# Altium footprint library Amirreza.PcbLib: 524 footprints (part 17 of 33)
Each footprint in its own frame and in the unit in brackets; x right, y up, seen from the top. Pads: shape width x height; smd on the part's side, far side on the other; paste and mask are expansions set on the pad; w line width, h text height; cw(c..) or ccw(c..) is an arc to the next point about the centre after c.
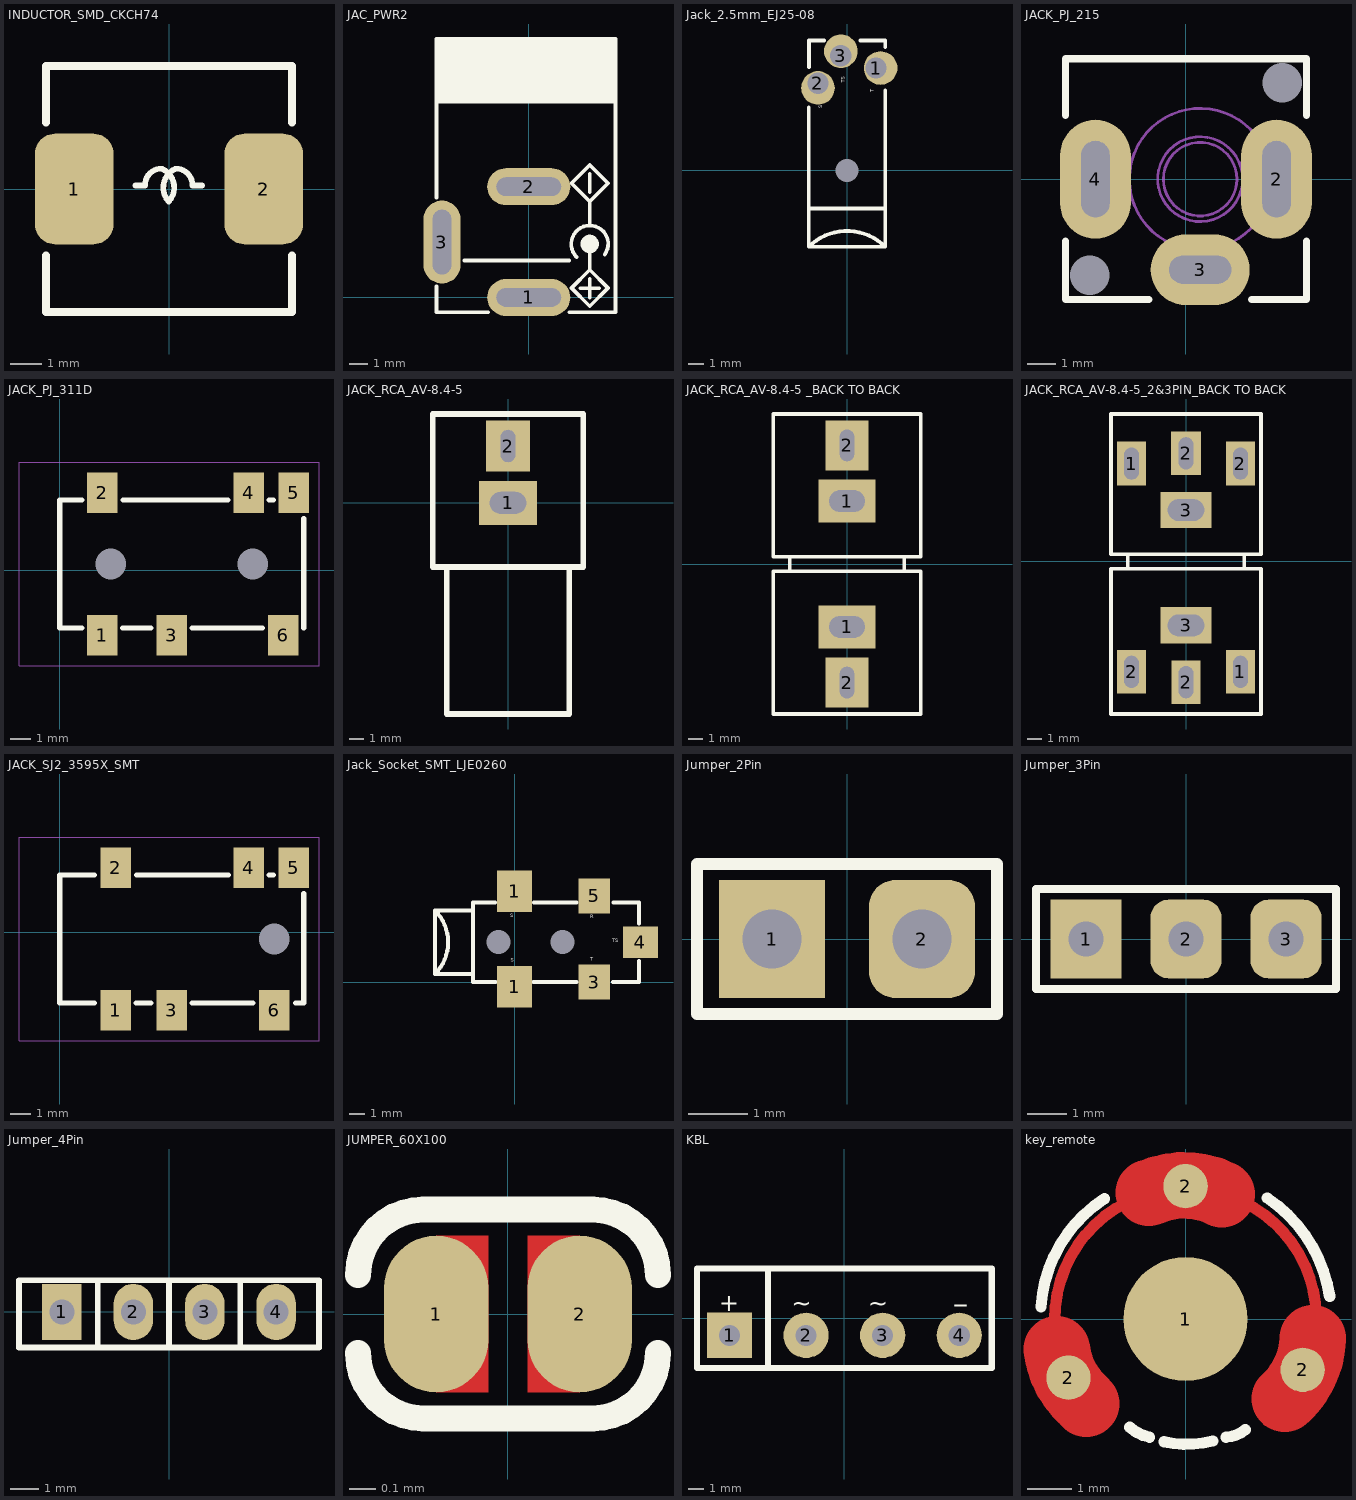
[diagram p16: the footprints below, top view; thin cyan lines are the x and y axes]

## INDUCTOR_SMD_CKCH74 [mm]
pads (2):
  rrect50% 2.5x3.5 smd: 1(-3,0) 2(3,0)
Top Overlay:
  lines w0.18: -1.061,0.112 -0.761,0.112 cw(c-0.247,0.127) -0.224,0.641 cw(c-0.487,0.046) -0.002,-0.388 ; -0.01,-0.395 cw(c0.469,0.046) 0.206,0.641 cw(c0.229,0.127) 0.743,0.112 1.043,0.112
  lines w0.254: -3.9,-2.1 -3.9,-3.9 3.9,-3.9 3.9,-2.1 ; -3.9,2.1 -3.9,3.9 3.9,3.9 3.9,2.1
3D body "User Library-DE0704.step": height 4.5, standoff 0, extent -3.65,-3.65 3.65,3.65

## JAC_PWR2 [mm] "DC POWER JACK, Power Jack KLDX-0202"
pads (3):
  oval 4.5x2 hole 1 slot 3.5 at 0 deg: 1(0,0) 2(0,6)
  oval 2x4.5 hole 1 slot 3.5 at 90 deg: 3(-4.7,3)
Top Overlay:
  circle w0.4: c3.3,2.9 r0.3
  rectangle: -5,10.5 4.7,14
  lines w0.2: -5,0.6 -5,-0.8 -2.2,-0.8 ; -5,5.4 -5,14 4.7,14 4.7,-0.8 2.2,-0.8 ; -3.5,2 2.2,2 ; 2.593,2.193 cw(c3.3,2.9) 4.119,2.326 ; 2.8,0.5 3.8,0.5 ; 3.3,0 3.3,1 ; 3.3,2.9 3.3,1.5 ; 3.3,3.9 3.3,5.2 ; 3.3,5.7 3.3,6.7 ; 3.3,1.5 2.31,0.51 3.3,-0.48 4.29,0.51 3.3,1.5 ; 3.3,5.2 4.29,6.19 3.3,7.18 2.31,6.19 3.3,5.2
3D body "KLDX-0202-A_rD2.STEP": height 10.8, standoff -4.1, extent -4.9,-0.65 4.5,13.85

## Jack_2.5mm_EJ25-08 [mm]
pads (4):
  round 0 hole 1.5: 0(0,0)
  round 2.2 hole 1.4 copper offset 0.3,0: 1(1.9,6.7)
  round 2.2 hole 1.4 copper offset 0,-0.3: 2(-1.9,5.7)
  round 2.2 hole 1.4 copper offset 0,0.3: 3(-0.4,7.5)
Top Overlay:
  lines w0.254: -2.5,4.11 -2.5,-2.5 ; -2.498,6.769 -2.498,8.5 -1.506,8.5 ; 0.894,8.51 2.5,8.51 2.5,8.06 ; 2.5,-2.5 -2.5,-2.5 ; 2.5,5.235 2.5,-5 ; -2.5,-5 cw(c0,-7.5) 2.5,-5 ; -2.5,-5 -2.5,-2.5 ; -2.5,-5 2.5,-5
  text "T" at 1.854,5.105 h0.4
  text "TS" at -0.051,5.74 h0.4
  text "S" at -1.524,4.064 h0.4
3D body "User Library-MS-108.STEP": height 5.9, standoff -1.6, extent -2.485,-4.405 2.515,6.995

## JACK_PJ_215 [mm] "Jack, Audio, Stereo, HT, 2.5mm, THD, PJ-215"
height 5.2
pads (5):
  oval 2.5x4.2 hole 1 slot 2.7 at 90 deg: 2(3.2,0) 4(-3.2,0)
  oval 3.5x2.5 hole 1 slot 2.2 at 0 deg: 3(0.5,-3.2)
  round 0 hole 1.4 unplated: ""(-3.4,-3.4) ""(3.4,3.4)
Top Overlay:
  lines w0.254: -4.254,-2.184 -4.254,-4.254 -1.315,-4.254 ; -4.254,2.261 -4.254,4.254 4.254,4.254 4.254,2.261 ; 2.318,-4.254 4.254,-4.254 4.254,-2.184
Mechanical 1:
  circle w0.1: c0.5,0 r1.5
  circle w0.1: c0.5,0 r2.5
  circle w0.1: c0.5,0 r1.3
3D body "pj-301c.stp": height 14, standoff -3.3, extent -5.131,-4.25 5.069,4.25

## JACK_PJ_311D [mm]
pads (8):
  round 0 hole 1.5 unplated: 0(2.5,0.317) 0(9.5,0.317)
  rect 1.5x2 smd: 1(2.1,-3.183) 2(2.1,3.817) 3(5.5,-3.183) 4(9.3,3.817) 5(11.5,3.817) 6(11,-3.183)
Top Overlay:
  lines w0.254: 1.092,-2.833 0,-2.833 0,3.467 1.093,3.467 ; 3.1,-2.833 4.496,-2.833 ; 3.125,3.467 8.28,3.467 ; 6.509,-2.833 9.962,-2.833 ; 10.286,3.467 10.512,3.467 ; 12,-2.833 12,2.538
Mechanical 13:
  lines w0.05: -2,-4.683 12.75,-4.683 12.75,5.317 -2,5.317 -2,-4.683
3D body "PJ311D_WOPos.STEP": height 4.8, standoff -0.7, extent -1.997,-4.032 12.303,4.468

## JACK_RCA_AV-8.4-5 [mm]
pads (2):
  rect 4x3 hole 1.5 slot 2.5 at 0 deg: 1(0,0)
  rect 3x3.5 hole 2.2 slot 1 at 0 deg: 2(0,3.9)
Top Overlay:
  lines w0.4: -4.2,-4.4 -4.2,-14.478 4.2,-14.478 4.2,-4.4 ; -5.16,-4.4 -5.16,6.096 5.16,6.096 5.16,-4.4 -5.16,-4.4
3D body "User Library-161-0097-kobiconn.step": height 13.02, standoff -3.97, extent -5.051,-14.326 4.957,5.182

## JACK_RCA_AV-8.4-5 _BACK TO BACK [mm]
pads (4):
  rect 4x3 hole 1.5 slot 2.5 at 0 deg: 1(0,-4.4) 1(0,4.4)
  rect 3x3.5 hole 2.2 slot 1 at 0 deg: 2(0,-8.3) 2(0,8.3)
Top Overlay:
  lines w0.254: -4,-0.5 -4,0.5 ; 4,-0.5 4,0.5 ; -5.16,-10.496 -5.16,-0.5 5.16,-0.5 5.16,-10.496 -5.16,-10.496 ; -5.16,0.5 -5.16,10.496 5.16,10.496 5.16,0.5 -5.16,0.5
3D body "User Library-161-0097-kobiconn.step": height 13.02, standoff -3.97, extent -4.957,-9.582 5.051,9.926

## JACK_RCA_AV-8.4-5_2&3PIN_BACK TO BACK [mm]
pads (8):
  rect 2x3 hole 2.2 slot 1 at 0 deg: 1(-3.75,6.74) 1(3.75,-7.6) 2(-3.75,-7.6) 2(0,-8.3) 2(3.75,6.74)
  rect 2.032x3 hole 2.2 slot 1 at 0 deg: 2(0,7.44)
  rect 3.5x2.5 hole 1.5 slot 2.5 at 0 deg: 3(0,-4.4) 3(0,3.54)
Top Overlay:
  lines w0.254: -4,-0.5 -4,0.5 ; 4,-0.5 4,0.5 ; -5.16,-10.496 5.16,-10.496 5.16,-0.5 -5.16,-0.5 -5.16,-10.496 ; -5.16,0.5 5.16,0.5 5.16,10.148 -5.16,10.148 -5.16,0.5
3D body "User Library-161-0097-kobiconn.step": height 13.02, standoff -3.97, extent -4.957,-9.582 5.051,9.926

## JACK_SJ2_3595X_SMT [mm]
pads (7):
  round 0 hole 1.5: 0(10.55,-0.322)
  rect 1.5x2 smd: 1(2.75,-3.822) 2(2.75,3.178) 3(5.5,-3.822) 4(9.3,3.178) 5(11.5,3.178) 6(10.55,-3.822)
Top Overlay:
  lines w0.254: 1.707,2.828 0,2.828 0,-3.472 1.717,-3.472 ; 3.748,-3.472 4.496,-3.472 ; 3.785,2.828 8.289,2.828 ; 6.509,-3.472 9.505,-3.472 ; 10.286,2.828 10.512,2.828 ; 11.589,-3.472 12,-3.472 12,1.899
Mechanical 13:
  lines w0.05: -2,-5.322 -2,4.678 12.75,4.678 12.75,-5.322 -2,-5.322
3D body "CUI_DEVICES_SJ2-35954D-SMT-TR.step": height 4.49, standoff -0.51, extent -2,-4.471 12,3.829

## Jack_Socket_SMT_LJE0260 [mm]
pads (7):
  round 0 hole 1.5: 0(-1,2.5) 0(3,2.5)
  rect 2.2x2.6 smd: 1(0,-0.3) 1(0,5.7)
  rect 2x2.2 smd: 3(5,0) 5(5,5.4)
  rect 2.2x2 smd: 4(7.9,2.5)
Top Overlay:
  lines w0.254: -2.6,0.5 -5,0.5 ; -2.6,4.5 -5,4.5 ; -1.228,5 -2.6,5 -2.6,0 -1.194,0 ; 1.194,0 3.886,0 ; 1.221,5 3.888,5 ; 6.172,0 7.8,0 7.8,1.319 ; 6.194,5 7.8,5 7.8,3.681 ; -5,0.5 ccw(c-7,2.5) -5,4.5 ; -5,0.5 -5,4.5
  text "T" at 4.75,1.245 h0.4
  text "R" at 4.75,3.912 h0.4
  text "TS" at 6.121,2.413 h0.4
  text "S" at -0.279,3.962 h0.4
  text "S" at -0.229,1.168 h0.4

## Jumper_2Pin [mm]
pads (2):
  rect 1.8x2 hole 1: 1(-1.27,0)
  rrect50% 1.8x2 hole 1: 2(1.27,0)
Top Overlay:
  lines w0.2: -2.54,-1.27 2.54,-1.27 2.54,1.27 -2.54,1.27 -2.54,-1.27
3D body "User Library-jumper 2_54mm.step": height 10, standoff 4, extent -2.5,-1.2 2.5,1.2
3D body "CircuitWorks-HEADER 2_54 VERTICAL 2X.step": height 8.55, standoff -2.45, extent -2.54,-1.25 2.54,1.25

## Jumper_3Pin [mm]
pads (3):
  rect 1.8x2 hole 0.9: 1(-2.54,0)
  rrect50% 1.8x2 hole 0.9: 2(0,0) 3(2.54,0)
Top Overlay:
  lines w0.2: -3.81,-1.27 -3.81,1.27 3.81,1.27 3.81,-1.27 -3.81,-1.27
3D body "User Library-PinHeaderX3.STEP": height 8.56, standoff -3.63, extent -3.81,-1.472 3.81,1.448
3D body "User Library-jumper 2_54mm.step": height 10, standoff 4, extent -3.77,-1.2 1.23,1.2

## Jumper_4Pin [mm]
pads (4):
  rect 1.4x2 hole 0.889: 1(-3.81,0)
  oval 1.4x2 hole 0.889: 2(-1.27,0) 3(1.27,0) 4(3.81,0)
Top Overlay:
  lines w0.2: -5.336,-1.27 -5.336,1.119 5.332,1.119 ; -5.336,-1.269 5.332,-1.269 ; -2.542,-1.27 -2.542,1.119 ; -0.002,-1.27 -0.002,1.119 ; 2.538,-1.27 2.538,1.119 ; 5.332,-1.27 5.332,1.068

## JUMPER_60X100 [mm] "JUMPER SOLDER 0.6X0.5MM"
height 0.6
pads (2):
  oval 0.4x0.6 smd paste-2 mask+0.05: 1(-0.275,0) 2(0.275,0)
Top Layer:
  region: -0.275,0.3 -0.075,0.3 -0.075,-0.3 -0.275,-0.3
  region: 0.275,0.3 0.075,0.3 0.075,-0.3 0.275,-0.3
Top Overlay:
  lines w0.1: -0.575,-0.15 ccw(c-0.325,-0.15) -0.325,-0.4 0.325,-0.4 ccw(c0.325,-0.15) 0.575,-0.15 ; -0.575,0.15 cw(c-0.325,0.15) -0.325,0.4 0.325,0.4 cw(c0.325,0.15) 0.575,0.15
Top Solder:
  region: -0.275,-0.35 -0.275,0.35 0.275,0.35 0.275,-0.35

## KBL [mm]
pads (4):
  rect 3x3 hole 1.4: 1(-7.62,-1.142)
  round 3 hole 1.4: 2(-2.54,-1.142) 3(2.54,-1.142) 4(7.62,-1.142)
Top Overlay:
  lines w0.4: -5.08,-3.301 -5.08,3.303 ; -9.78,-3.303 -9.78,3.303 9.78,3.303 9.78,-3.303 -9.78,-3.303
  text "+" at -6.985,1.837 h2
  text "~" at 2.921,1.851 h2
  text "~" at -2.159,1.851 h2
  text "_" at 8.128,0.917 h2
3D body "User Library-KBL406.step": height 15.8, standoff -13.32, extent -9.525,-3.282 9.475,3.029

## key_remote [mm]
pads (4):
  round 2.8 smd: 1(0,0)
  round 1 smd: 2(-2.642,-1.321) 2(0,2.997) 2(2.642,-1.143)
Top Layer:
  lines w0.254: -1.799,-2.338 cw(c0,0) 1.85,-2.298
  lines w1.5: -2.906,-0.675 ccw(c-0.999,-0.433) -2.235,-1.905 ; -0.827,2.844 cw(c-0.033,1.093) 0.813,2.819 ; 2.234,-1.8 ccw(c0.949,-0.371) 2.87,-0.432
Top Overlay:
  lines w0.254: -3.261,0.278 cw(c-0.116,0.07) -1.828,2.717 ; -1.26,-2.441 ccw(c-0.593,-1.679) -0.813,-2.667 ; -0.488,-2.765 ccw(c0.03,-0.47) 0.611,-2.75 ; 0.913,-2.662 ccw(c0.894,-1.975) 1.346,-2.493 ; 1.841,2.732 cw(c0.009,0.012) 3.251,0.508